# Altium footprint library 总库.PcbLib: 264 footprints (part 17 of 17)
Each footprint in its own frame and in the unit in brackets; x right, y up, seen from the top. Pads: shape width x height; smd on the part's side, far side on the other; paste and mask are expansions set on the pad; w line width, h text height; cw(c..) or ccw(c..) is an arc to the next point about the centre after c.
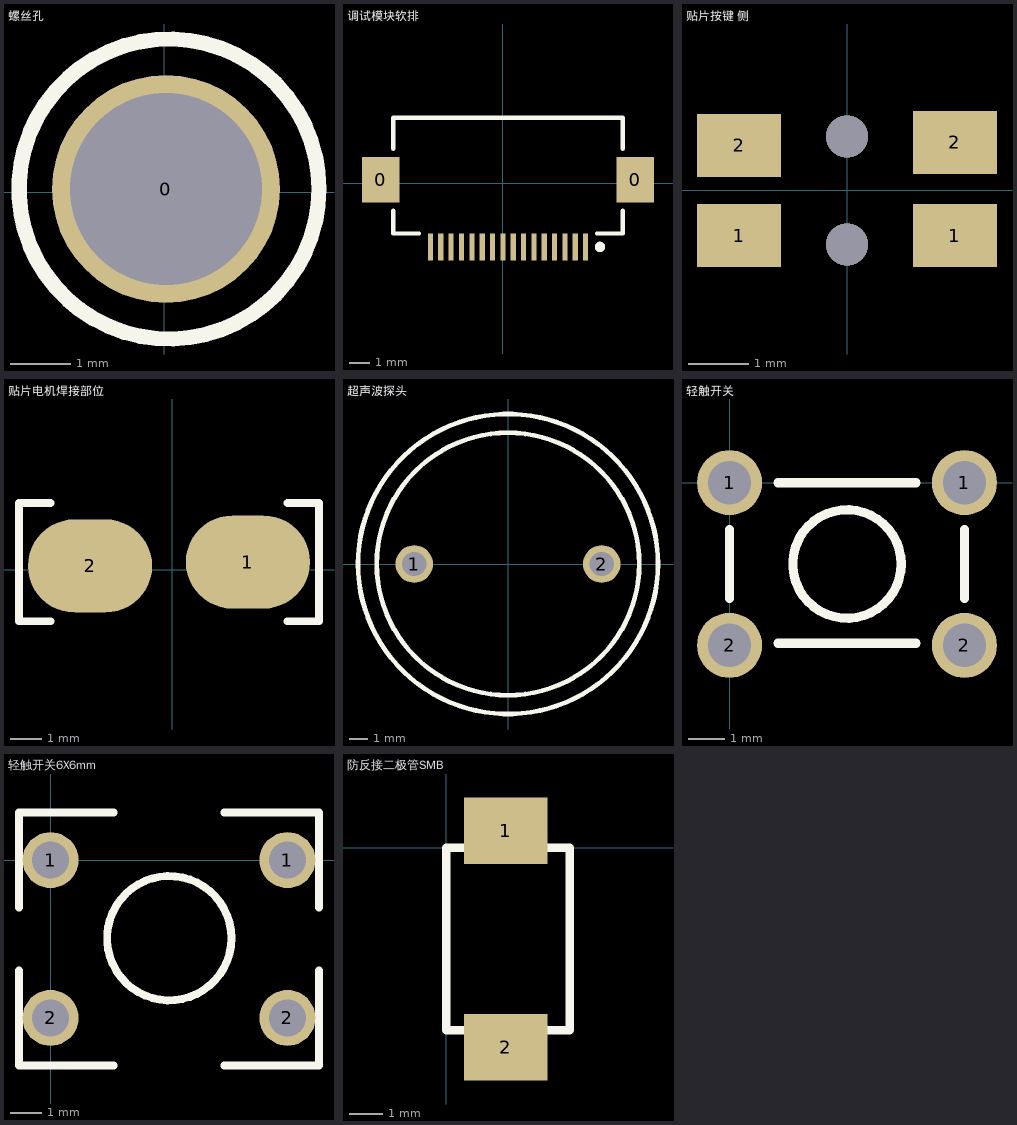
[diagram p16: the footprints below, top view; thin cyan lines are the x and y axes]

## 螺丝孔 [mm]
pads (1):
  round 3.8 hole 3.2: 0(0.025,0.051)
Top Overlay:
  circle w0.254: c0.076,0.051 r2.5
3D body: height 2.37, standoff -4, extent -2.724,-2.749 2.876,2.851
3D body: height -1.58, standoff -8.58, extent -2.504,-2.214 2.692,2.286

## 调试模块软排 [mm]
pads (18):
  rect 1.8x2.2 smd: 0(-5.897,0.177) 0(6.419,0.177)
  rect 0.25x1.3 smd: 1(4.011,-3.073) 2(3.511,-3.073) 3(3.011,-3.073) 4(2.511,-3.073) 5(2.011,-3.073) 6(1.511,-3.073) 7(1.011,-3.073) 8(0.511,-3.073) 9(0.011,-3.073) 10(-0.489,-3.073) 11(-0.989,-3.073) 12(-1.489,-3.073) 13(-1.989,-3.073) 14(-2.489,-3.073) 15(-2.989,-3.073) 16(-3.489,-3.073)
Top Overlay:
  circle w0.25: c4.711,-3.073 r0.125
  lines w0.2: -5.289,-1.323 -5.289,-2.423 -4.039,-2.423 ; -5.289,1.677 -5.289,3.177 ; -5.276,3.177 5.811,3.177 5.811,1.677 ; 4.561,-2.423 5.811,-2.423 5.811,-1.323

## 贴片按键 侧 [mm]
pads (4):
  rect 1.4x1.05 smd: 1(-1.8,-0.75) 1(1.8,-0.75) 2(-1.8,0.75) 2(1.8,0.8)
via 0,0.9 diameter 0.7 hole 0.7
via 0,-0.9 diameter 0.7 hole 0.7
3D body: height 1.5, standoff 0, extent -1.8,-1.45 1.8,1.55
3D body: height 1.2, standoff 0.5, extent -0.75,1.525 0.75,2.5

## 贴片电机焊接部位 [mm]
pads (2):
  oval 4x3 smd: 1(2.438,0.254) 2(-2.642,0.127)
Top Overlay:
  lines w0.254: -3.912,-1.651 -4.928,-1.651 -4.928,2.159 -3.912,2.159 ; 3.708,-1.651 4.724,-1.651 4.724,2.159 3.708,2.159

## 超声波探头 [mm]
pads (2):
  round 2 hole 1.3: 1(-5,0) 2(5,0)
Top Overlay:
  circle w0.254: c0,0 r7
  circle w0.254: c0,0 r8
3D body: height 12.1, standoff 0, extent -7.011,-7.011 7.011,7.011
3D body: height 12, standoff 0, extent -8.012,-8.012 8.012,8.012

## 轻触开关 [mm]
pads (4):
  round 1.8 hole 1.2: 1(0,0) 1(6.5,0) 2(0,-4.5) 2(6.5,-4.5)
Top Overlay:
  circle w0.254: c3.25,-2.25 r1.5
  lines w0.254: 0,-3.203 0,-1.298 ; 1.345,-4.445 5.155,-4.445 ; 1.345,0 5.155,0 ; 6.5,-3.203 6.5,-1.298

## 轻触开关6X6mm [mm]
pads (4):
  round 1.8 hole 1.2: 1(0,0) 1(7.62,0) 2(0,-5.08) 2(7.62,-5.08)
Top Overlay:
  circle w0.254: c3.819,-2.515 r2
  lines w0.254: -1.016,-3.556 -1.016,-6.604 2.032,-6.604 ; -1.016,-1.524 -1.016,1.524 2.032,1.524 ; 5.588,-6.604 8.636,-6.604 8.636,-3.556 ; 5.588,1.524 8.636,1.524 8.636,-1.524
3D body: height 6.53, standoff -1.99, extent -0.138,-5.537 7.605,0.493

## 防反接二极管SMB [mm]
pads (2):
  rect 2.5x2 smd: 1(1.778,0.508) 2(1.778,-5.969)
Top Overlay:
  lines w0.254: 0,-5.461 0,0 3.683,0 3.683,-5.461 0,-5.461